# Altium footprint library Generic Footprint.PcbLib: 160 footprints (part 8 of 20) (continued)
## Symbol_CE-Logo-1.5x1mm_Silkscreen [mm] (continued)
1(0.638,0.019) 1(0.638,0.02) 1(0.638,0.022) 1(0.638,0.023) 1(0.638,0.025) 1(0.638,0.026) 1(0.638,0.028) 1(0.638,0.029) 1(0.638,0.031) 1(0.638,0.032) 1(0.638,0.034) 1(0.638,0.035) 1(0.638,0.037) 1(0.638,0.038) 1(0.638,0.04) 1(0.638,0.041) 1(0.638,0.043) 1(0.638,0.044) 1(0.638,0.046) 1(0.638,0.047) 1(0.638,0.049) 1(0.638,0.05) 1(0.638,0.052) 1(0.638,0.053) 1(0.638,0.055) 1(0.638,0.056) 1(0.638,0.058) 1(0.638,0.059) 1(0.638,0.061) 1(0.638,0.062) 1(0.638,0.064) 1(0.638,0.065) 1(0.638,0.067) 1(0.638,0.068) 1(0.638,0.07) 1(0.638,0.071) 1(0.638,0.073) 1(0.638,0.074) 1(0.638,0.076) 1(0.638,0.077) 1(0.638,0.079) 1(0.638,0.08) 1(0.638,0.082) 1(0.638,0.083) 1(0.638,0.085) 1(0.638,0.086) 1(0.638,0.088) 1(0.638,0.089) 1(0.638,0.091) 1(0.638,0.092) 1(0.638,0.094) 1(0.638,0.095) 1(0.638,0.097) 1(0.638,0.098) 1(0.638,0.1) 1(0.638,0.101) 1(0.638,0.103) 1(0.638,0.104) 1(0.638,0.106) 1(0.638,0.107) 1(0.638,0.109) 1(0.638,0.11) 1(0.638,0.112) 1(0.638,0.113) 1(0.638,0.115) 1(0.638,0.116) 1(0.638,0.118) 1(0.638,0.119) 1(0.638,0.121) 1(0.638,0.122) 1(0.638,0.124) 1(0.638,0.125) 1(0.638,0.127) 1(0.638,0.128) 1(0.638,0.13) 1(0.638,0.131) 1(0.638,0.133) 1(0.638,0.134) 1(0.638,0.136) 1(0.638,0.137) 1(0.638,0.139) 1(0.638,0.14) 1(0.638,0.142) 1(0.638,0.143) 1(0.638,0.145) 1(0.638,0.146) 1(0.638,0.148) 1(0.638,0.149) 1(0.638,0.151) 1(0.638,0.152) 1(0.638,0.154) 1(0.638,0.155) 1(0.638,0.157) 1(0.638,0.158) 1(0.638,0.16) 1(0.638,0.161) 1(0.638,0.163) 1(0.638,0.164) 1(0.638,0.166) 1(0.638,0.167) 1(0.638,0.902) 1(0.638,0.904) 1(0.638,0.905) 1(0.638,0.907) 1(0.638,0.908) 1(0.638,0.91) 1(0.638,0.911) 1(0.638,0.913) 1(0.638,0.914) 1(0.638,0.916) 1(0.638,0.917) 1(0.638,0.919) 1(0.638,0.92) 1(0.638,0.922) 1(0.638,0.923) 1(0.638,0.925) 1(0.638,0.926) 1(0.638,0.928) 1(0.638,0.929) 1(0.638,0.931) 1(0.638,0.932) 1(0.638,0.934) 1(0.638,0.935) 1(0.638,0.937) 1(0.638,0.938) 1(0.638,0.94) 1(0.638,0.941) 1(0.638,0.943) 1(0.638,0.944) 1(0.638,0.946) 1(0.638,0.947) 1(0.638,0.949) 1(0.638,0.95) 1(0.638,0.952) 1(0.638,0.953) 1(0.638,0.955) 1(0.638,0.956) 1(0.638,0.958) 1(0.638,0.959) 1(0.638,0.961) 1(0.638,0.962) 1(0.638,0.964) 1(0.638,0.965) 1(0.638,0.967) 1(0.638,0.968) 1(0.638,0.97) 1(0.638,0.971) 1(0.638,0.973) 1(0.638,0.974) 1(0.638,0.976) 1(0.638,0.977) 1(0.638,0.979) 1(0.638,0.98) 1(0.638,0.982) 1(0.638,0.983) 1(0.638,0.985) 1(0.638,0.986) 1(0.638,0.988) 1(0.638,0.989) 1(0.638,0.991) 1(0.638,0.992) 1(0.638,0.994) 1(0.638,0.995) 1(0.638,0.997) 1(0.638,0.998) 1(0.638,1) 1(0.638,1.001) 1(0.638,1.003) 1(0.638,1.004) 1(0.638,1.006) 1(0.638,1.007) 1(0.638,1.009) 1(0.638,1.01) 1(0.638,1.012) 1(0.638,1.013) 1(0.638,1.015) 1(0.638,1.016) 1(0.638,1.018) 1(0.638,1.019) 1(0.638,1.021) 1(0.638,1.022) 1(0.638,1.024) 1(0.638,1.025) 1(0.638,1.027) 1(0.638,1.028) 1(0.638,1.03) 1(0.638,1.031) 1(0.638,1.033) 1(0.638,1.034) 1(0.638,1.036) 1(0.638,1.037) 1(0.638,1.039) 1(0.638,1.04) 1(0.638,1.042) 1(0.638,1.043) 1(0.638,1.045) 1(0.638,1.046) 1(0.638,1.048) 1(0.638,1.049) 1(0.638,1.051) 1(0.638,1.052) 1(0.64,1.054) 1(0.956,0.511) 1(0.956,0.512) 1(0.956,0.514) 1(0.956,0.515) 1(0.956,0.517) 1(0.956,0.541) 1(0.956,0.542) 1(0.956,0.544) 1(0.956,0.547) 1(0.956,0.548) 1(0.956,0.55) 1(0.956,0.551) 1(0.956,0.553) 1(0.956,0.554) 1(0.956,0.556) 1(0.956,0.557) 1(0.956,0.559) 1(0.958,0.509) 1(0.958,0.518) 1(0.958,0.52) 1(0.958,0.521) 1(0.958,0.523) 1(0.958,0.524) 1(0.958,0.526) 1(0.958,0.527) 1(0.958,0.529) 1(0.958,0.53) 1(0.958,0.532) 1(0.958,0.533) 1(0.958,0.535) 1(0.958,0.536) 1(0.958,0.538) 1(0.958,0.539) 1(0.959,0.481) 1(0.959,0.482) 1(0.959,0.484) 1(0.959,0.485) 1(0.959,0.487) 1(0.959,0.488) 1(0.959,0.49) 1(0.959,0.491) 1(0.959,0.493) 1(0.959,0.494) 1(0.959,0.496) 1(0.959,0.497) 1(0.959,0.499) 1(0.959,0.5) 1(0.959,0.502) 1(0.959,0.503) 1(0.959,0.505) 1(0.959,0.506) 1(0.959,0.508) 1(0.959,0.545) 1(0.959,0.56) 1(0.959,0.562) 1(0.959,0.563) 1(0.959,0.565) 1(0.959,0.566) 1(0.959,0.568) 1(0.959,0.569) 1(0.959,0.571) 1(0.959,0.572) 1(0.959,0.574) 1(0.959,0.575) 1(0.959,0.577) 1(0.959,0.578) 1(0.959,0.58) 1(0.959,0.581) 1(0.961,0.478) 1(0.961,0.479) 1(0.962,0.454) 1(0.962,0.455) 1(0.962,0.461) 1(0.962,0.466) 1(0.962,0.469) 1(0.962,0.47) 1(0.962,0.472) 1(0.962,0.475) 1(0.962,0.476) 1(0.962,0.583) 1(0.962,0.586) 1(0.962,0.589) 1(0.962,0.59) 1(0.962,0.592) 1(0.962,0.593) 1(0.962,0.595) 1(0.962,0.596) 1(0.962,0.598) 1(0.962,0.599) 1(0.962,0.602) 1(0.962,0.608) 1(0.962,0.613) 1(0.964,0.449) 1(0.964,0.451) 1(0.964,0.452) 1(0.964,0.457) 1(0.964,0.458) 1(0.964,0.46) 1(0.964,0.463) 1(0.964,0.464) 1(0.964,0.467) 1(0.964,0.473) 1(0.964,0.584) 1(0.964,0.587) 1(0.964,0.601) 1(0.964,0.604) 1(0.964,0.605) 1(0.964,0.607) 1(0.964,0.61) 1(0.964,0.611) 1(0.964,0.614) 1(0.965,0.445) 1(0.965,0.446) 1(0.965,0.448) 1(0.965,0.616) 1(0.965,0.617) 1(0.965,0.619) 1(0.965,0.62) 1(0.967,0.43) 1(0.967,0.431) 1(0.967,0.44) 1(0.967,0.622) 1(0.967,0.623) 1(0.967,0.626) 1(0.967,0.632) 1(0.967,0.635) 1(0.968,0.424) 1(0.968,0.425) 1(0.968,0.427) 1(0.968,0.428) 1(0.968,0.433) 1(0.968,0.434) 1(0.968,0.436) 1(0.968,0.437) 1(0.968,0.439) 1(0.968,0.442) 1(0.968,0.443) 1(0.968,0.625) 1(0.968,0.628) 1(0.968,0.629) 1(0.968,0.631) 1(0.968,0.634) 1(0.968,0.637) 1(0.968,0.638) 1(0.968,0.644) 1(0.97,0.421) 1(0.97,0.422) 1(0.97,0.64) 1(0.97,0.641) 1(0.97,0.643) 1(0.971,0.415) 1(0.971,0.419) 1(0.973,0.406) 1(0.973,0.407) 1(0.973,0.409) 1(0.973,0.41) 1(0.973,0.412) 1(0.973,0.413) 1(0.973,0.416) 1(0.973,0.418) 1(0.973,0.646) 1(0.973,0.647) 1(0.973,0.649) 1(0.973,0.65) 1(0.973,0.652) 1(0.973,0.653) 1(0.973,0.655) 1(0.973,0.656) 1(0.973,0.658) 1(0.973,0.662) 1(0.974,0.401) 1(0.974,0.403) 1(0.974,0.404) 1(0.974,0.659) 1(0.974,0.661) 1(0.976,0.4) 1(0.976,0.664) 1(0.977,0.386) 1(0.977,0.389) 1(0.977,0.391) 1(0.977,0.392) 1(0.977,0.394) 1(0.977,0.395) 1(0.977,0.397) 1(0.977,0.398) 1(0.977,0.665) 1(0.977,0.667) 1(0.977,0.668) 1(0.977,0.67) 1(0.977,0.671) 1(0.977,0.673) 1(0.977,0.676) 1(0.977,0.677) 1(0.979,0.388) 1(0.979,0.674) 1(0.982,0.376) 1(0.982,0.38) 1(0.982,0.382) 1(0.982,0.383) 1(0.982,0.385) 1(0.982,0.679) 1(0.982,0.685) 1(0.983,0.371) 1(0.983,0.373) 1(0.983,0.374) 1(0.983,0.377) 1(0.983,0.379) 1(0.983,0.68) 1(0.983,0.682) 1(0.983,0.683) 1(0.983,0.686) 1(0.983,0.688) 1(0.983,0.689) 1(0.983,0.691) 1(0.983,0.692) 1(0.986,0.359) 1(0.986,0.368) 1(0.986,0.694) 1(0.986,0.695) 1(0.986,0.697) 1(0.986,0.701) 1(0.988,0.358) 1(0.988,0.361) 1(0.988,0.362) 1(0.988,0.364) 1(0.988,0.365) 1(0.988,0.367) 1(0.988,0.37) 1(0.988,0.698) 1(0.988,0.7) 1(0.988,0.703) 1(0.988,0.704) 1(0.988,0.706) 1(0.988,0.707) 1(0.991,0.356) 1(0.992,0.344) 1(0.992,0.346) 1(0.992,0.347) 1(0.992,0.349) 1(0.992,0.35) 1(0.992,0.352) 1(0.992,0.353) 1(0.992,0.355) 1(0.992,0.709) 1(0.992,0.71) 1(0.992,0.712) 1(0.992,0.713) 1(0.992,0.715) 1(0.992,0.716) 1(0.992,0.718) 1(0.992,0.719) 1(0.994,0.343) 1(0.994,0.721) 1(0.995,0.722) 1(0.997,0.332) 1(0.997,0.334) 1(0.997,0.335) 1(0.997,0.337) 1(0.997,0.338) 1(0.997,0.34) 1(0.997,0.341) 1(0.997,0.724) 1(0.997,0.725) 1(0.997,0.727) 1(0.997,0.728) 1(0.997,0.73) 1(0.997,0.731) 1(0.998,0.329) 1(0.998,0.331) 1(1.001,0.32) 1(1.001,0.325) 1(1.001,0.328) 1(1.001,0.733) 1(1.001,0.734) 1(1.001,0.736) 1(1.001,0.737) 1(1.001,0.739) 1(1.001,0.74) 1(1.003,0.322) 1(1.003,0.323) 1(1.003,0.326) 1(1.003,0.742) 1(1.003,0.743) 1(1.003,0.745) 1(1.004,0.319) 1(1.006,0.31) 1(1.006,0.313) 1(1.006,0.316) 1(1.006,0.317) 1(1.006,0.746) 1(1.006,0.751) 1(1.007,0.311) 1(1.007,0.314) 1(1.007,0.748) 1(1.007,0.749) 1(1.007,0.752) 1(1.007,0.754) 1(1.007,0.755) 1(1.009,0.308) 1(1.01,0.307) 1(1.012,0.301) 1(1.012,0.302) 1(1.012,0.304) 1(1.012,0.305) 1(1.012,0.757) 1(1.012,0.758) 1(1.012,0.76) 1(1.012,0.761) 1(1.012,0.763) 1(1.012,0.764) 1(1.013,0.299) 1(1.015,0.295) 1(1.015,0.766) 1(1.016,0.29) 1(1.016,0.292) 1(1.016,0.293) 1(1.016,0.296) 1(1.016,0.298) 1(1.016,0.767) 1(1.016,0.769) 1(1.016,0.77) 1(1.016,0.772) 1(1.016,0.773) 1(1.018,0.775) 1(1.021,0.283) 1(1.021,0.284) 1(1.021,0.286) 1(1.021,0.287) 1(1.021,0.289) 1(1.021,0.776) 1(1.021,0.778) 1(1.021,0.779) 1(1.021,0.781) 1(1.022,0.28) 1(1.022,0.281) 1(1.022,0.782) 1(1.022,0.784) 1(1.025,0.272) 1(1.025,0.274) 1(1.025,0.785) 1(1.027,0.275) 1(1.027,0.277) 1(1.027,0.278) 1(1.027,0.787) 1(1.027,0.788) 1(1.028,0.271) 1(1.03,0.79) 1(1.03,0.793) 1(1.031,0.266) 1(1.031,0.268) 1(1.031,0.269) 1(1.031,0.791) 1(1.031,0.794) 1(1.031,0.796) 1(1.031,0.797) 1(1.031,0.799) 1(1.034,0.26) 1(1.034,0.262) 1(1.034,0.265) 1(1.034,0.802) 1(1.036,0.257) 1(1.036,0.259) 1(1.036,0.263) 1(1.036,0.8) 1(1.036,0.803) 1(1.036,0.805) 1(1.036,0.806) 1(1.036,0.808) 1(1.039,0.256) 1(1.04,0.251) 1(1.04,0.253) 1(1.04,0.254) 1(1.04,0.809) 1(1.04,0.811) 1(1.04,0.812) 1(1.045,0.242) 1(1.045,0.244) 1(1.045,0.245) 1(1.045,0.247) 1(1.045,0.248) 1(1.045,0.25) 1(1.045,0.814) 1(1.045,0.815) 1(1.045,0.817) 1(1.045,0.818) 1(1.045,0.82) 1(1.045,0.821) 1(1.045,0.823) 1(1.049,0.241) 1(1.049,0.824) 1(1.049,0.827) 1(1.051,0.238) 1(1.051,0.239) 1(1.051,0.826) 1(1.052,0.236) 1(1.054,0.23) 1(1.054,0.233) 1(1.054,0.235) 1(1.054,0.829) 1(1.054,0.832) 1(1.055,0.227) 1(1.055,0.229) 1(1.055,0.232) 1(1.055,0.83) 1(1.055,0.833) 1(1.055,0.835) 1(1.055,0.836) 1(1.057,0.838) 1(1.06,0.223) 1(1.06,0.224) 1(1.06,0.226) 1(1.06,0.839) 1(1.06,0.841) 1(1.06,0.842) 1(1.063,0.844) 1(1.064,0.218) 1(1.064,0.22) 1(1.064,0.221) 1(1.064,0.845) 1(1.064,0.847) 1(1.069,0.212) 1(1.069,0.214) 1(1.069,0.217) 1(1.069,0.848) 1(1.069,0.85) 1(1.069,0.851) 1(1.069,0.853) 1(1.07,0.209) 1(1.07,0.211) 1(1.07,0.215) 1(1.07,0.854) 1(1.07,0.856) 1(1.072,0.208) 1(1.073,0.205) 1(1.073,0.206) 1(1.073,0.857) 1(1.075,0.203) 1(1.075,0.859) 1(1.075,0.86) 1(1.076,0.862) 1(1.079,0.199) 1(1.079,0.2) 1(1.079,0.202) 1(1.079,0.863) 1(1.079,0.865) 1(1.079,0.866) 1(1.081,0.197) 1(1.084,0.194) 1(1.084,0.196) 1(1.084,0.868) 1(1.084,0.869) 1(1.084,0.871) 1(1.085,0.193) 1(1.088,0.188) 1(1.088,0.19) 1(1.088,0.191) 1(1.088,0.872) 1(1.088,0.874) 1(1.088,0.875) 1(1.093,0.187) 1(1.093,0.877) 1(1.093,0.88) 1(1.094,0.184) 1(1.094,0.185) 1(1.094,0.878) 1(1.097,0.178) 1(1.097,0.179) 1(1.097,0.181) 1(1.097,0.182) 1(1.097,0.881) 1(1.097,0.884) 1(1.099,0.173) 1(1.099,0.175) 1(1.099,0.176) 1(1.099,0.883) 1(1.099,0.886) 1(1.099,0.887) 1(1.099,0.889) 1(1.1,0.89) 1(1.102,0.172) 1(1.103,0.17) 1(1.103,0.892) 1(1.103,0.893) 1(1.103,0.895) 1(1.105,0.169) 1(1.106,0.167) 1(1.106,0.896) 1(1.108,0.166) 1(1.108,0.898) 1(1.108,0.899) 1(1.112,0.161) 1(1.112,0.163) 1(1.112,0.164) 1(1.112,0.901) 1(1.112,0.902) 1(1.112,0.904) 1(1.114,0.16) 1(1.117,0.157) 1(1.117,0.158) 1(1.117,0.905) 1(1.118,0.155) 1(1.118,0.907) 1(1.118,0.908) 1(1.118,0.91) 1(1.12,0.449) 1(1.12,0.454) 1(1.12,0.455) 1(1.12,0.613) 1(1.12,0.614) 1(1.121,0.154) 1(1.121,0.448) 1(1.121,0.451) 1(1.121,0.452) 1(1.121,0.457) 1(1.121,0.611) 1(1.121,0.616) 1(1.123,0.149) 1(1.123,0.151) 1(1.123,0.152) 1(1.123,0.446) 1(1.123,0.617) 1(1.123,0.619) 1(1.123,0.62) 1(1.123,0.911) 1(1.123,0.913) 1(1.124,0.443) 1(1.124,0.458) 1(1.124,0.622) 1(1.124,0.623) 1(1.124,0.914) 1(1.126,0.43) 1(1.126,0.431) 1(1.126,0.433) 1(1.126,0.434) 1(1.126,0.436) 1(1.126,0.437) 1(1.126,0.439) 1(1.126,0.44) 1(1.126,0.442) 1(1.126,0.445) 1(1.126,0.458) 1(1.126,0.611) 1(1.126,0.625) 1(1.126,0.626) 1(1.126,0.628) 1(1.126,0.629) 1(1.126,0.631) 1(1.126,0.632) 1(1.126,0.634) 1(1.126,0.635) 1(1.127,0.148) 1(1.127,0.428) 1(1.127,0.457) 1(1.127,0.611) 1(1.127,0.637) 1(1.129,0.146) 1(1.129,0.427) 1(1.129,0.457) 1(1.129,0.638) 1(1.129,0.64) 1(1.13,0.145) 1(1.13,0.413) 1(1.13,0.415) 1(1.13,0.416) 1(1.13,0.418) 1(1.13,0.419) 1(1.13,0.421) 1(1.13,0.422) 1(1.13,0.424) 1(1.13,0.425) 1(1.13,0.641) 1(1.13,0.643) 1(1.13,0.644) 1(1.13,0.646) 1(1.13,0.647) 1(1.13,0.649) 1(1.13,0.65) 1(1.132,0.916) 1(1.132,0.917) 1(1.132,0.919) 1(1.133,0.652) 1(1.133,0.653) 1(1.135,0.401) 1(1.135,0.403) 1(1.135,0.404) 1(1.135,0.406) 1(1.135,0.407) 1(1.135,0.409) 1(1.135,0.41) 1(1.135,0.412) 1(1.135,0.655) 1(1.135,0.656) 1(1.135,0.658) 1(1.135,0.659) 1(1.135,0.661) 1(1.135,0.662) 1(1.135,0.664) 1(1.135,0.665) 1(1.136,0.14) 1(1.136,0.142) 1(1.136,0.143) 1(1.136,0.4) 1(1.136,0.92) 1(1.136,0.922) 1(1.136,0.923) 1(1.138,0.667) 1(1.139,0.391) 1(1.139,0.392) 1(1.139,0.394) 1(1.139,0.395) 1(1.139,0.397) 1(1.139,0.668) 1(1.139,0.67) 1(1.139,0.671) 1(1.139,0.673) 1(1.139,0.674) 1(1.139,0.676) 1(1.139,0.677) 1(1.139,0.679) 1(1.141,0.136) 1(1.141,0.137) 1(1.141,0.139) 1(1.141,0.389) 1(1.141,0.398) 1(1.141,0.68) 1(1.141,0.925) 1(1.141,0.926) 1(1.141,0.928) 1(1.141,0.929) 1(1.142,0.389) 1(1.142,0.68) 1(1.142,0.929) 1(1.144,0.385) 1(1.144,0.386) 1(1.144,0.388) 1(1.144,0.389) 1(1.144,0.68) 1(1.145,0.134) 1(1.145,0.376) 1(1.145,0.377) 1(1.145,0.379) 1(1.145,0.38) 1(1.145,0.382) 1(1.145,0.383) 1(1.145,0.682) 1(1.145,0.683) 1(1.145,0.685) 1(1.145,0.686) 1(1.145,0.688) 1(1.145,0.689) 1(1.145,0.929) 1(1.145,0.931) 1(1.145,0.932) 1(1.147,0.131) 1(1.147,0.133) 1(1.147,0.934) 1(1.15,0.365) 1(1.15,0.367) 1(1.15,0.368) 1(1.15,0.37) 1(1.15,0.371) 1(1.15,0.373) 1(1.15,0.374) 1(1.15,0.691) 1(1.15,0.692) 1(1.15,0.694) 1(1.15,0.695) 1(1.15,0.697) 1(1.15,0.698) 1(1.151,0.127) 1(1.151,0.128) 1(1.151,0.13) 1(1.151,0.935) 1(1.151,0.937) 1(1.151,0.938) 1(1.153,0.125) 1(1.153,0.7) 1(1.154,0.125) 1(1.154,0.356) 1(1.154,0.358) 1(1.154,0.359) 1(1.154,0.361) 1(1.154,0.362) 1(1.154,0.364) 1(1.154,0.701) 1(1.154,0.703) 1(1.154,0.704) 1(1.154,0.706) 1(1.154,0.707) 1(1.156,0.122) 1(1.156,0.124) 1(1.156,0.125) 1(1.156,0.94) 1(1.156,0.941) 1(1.157,0.121) 1(1.157,0.709) 1(1.157,0.943) 1(1.159,0.352) 1(1.159,0.353) 1(1.159,0.355) 1(1.159,0.71) 1(1.159,0.712) 1(1.159,0.713) 1(1.159,0.716) 1(1.159,0.718) 1(1.16,0.715) 1(1.162,0.121) 1(1.162,0.35) 1(1.163,0.121) 1(1.163,0.343) 1(1.163,0.346) 1(1.163,0.347) 1(1.163,0.349) 1(1.163,0.719) 1(1.163,0.721) 1(1.163,0.722) 1(1.165,0.116) 1(1.165,0.119) 1(1.165,0.341) 1(1.165,0.344) 1(1.165,0.724) 1(1.165,0.944) 1(1.165,0.946) 1(1.165,0.947) 1(1.166,0.118) 1(1.168,0.34) 1(1.169,0.115) 1(1.169,0.332) 1(1.169,0.334) 1(1.169,0.335) 1(1.169,0.337) 1(1.169,0.338) 1(1.169,0.725) 1(1.169,0.727) 1(1.169,0.728) 1(1.169,0.73) 1(1.169,0.731) 1(1.169,0.733) 1(1.169,0.949) 1(1.171,0.112) 1(1.171,0.113) 1(1.171,0.95) 1(1.171,0.952) 1(1.171,0.953) 1(1.174,0.328) 1(1.174,0.329) 1(1.174,0.331) 1(1.174,0.734) 1(1.174,0.736) 1(1.174,0.737) 1(1.174,0.955) 1(1.175,0.107) 1(1.175,0.109) 1(1.175,0.11) 1(1.175,0.956) 1(1.177,0.326) 1(1.177,0.739) 1(1.177,0.958) 1(1.178,0.317) 1(1.178,0.319) 1(1.178,0.32) 1(1.178,0.322) 1(1.178,0.323) 1(1.178,0.325) 1(1.178,0.74) 1(1.178,0.742) 1(1.178,0.743) 1(1.178,0.745) 1(1.178,0.746) 1(1.18,0.106) 1(1.181,0.106) 1(1.181,0.748) 1(1.183,0.106) 1(1.183,0.314) 1(1.183,0.316) 1(1.183,0.749) 1(1.183,0.751) 1(1.184,0.103) 1(1.184,0.313) 1(1.184,0.959) 1(1.184,0.961) 1(1.184,0.962) 1(1.186,0.101) 1(1.186,0.104) 1(1.186,0.752) 1(1.187,0.311) 1(1.187,0.754) 1(1.187,0.755) 1(1.187,0.76) 1(1.189,0.1) 1(1.189,0.308) 1(1.189,0.31) 1(1.189,0.757) 1(1.189,0.758) 1(1.189,0.761) 1(1.189,0.964) 1(1.19,0.098) 1(1.19,0.965) 1(1.19,0.967) 1(1.192,0.097) 1(1.192,0.305) 1(1.192,0.307) 1(1.193,0.298) 1(1.193,0.299) 1(1.193,0.301) 1(1.193,0.302) 1(1.193,0.304) 1(1.193,0.763) 1(1.193,0.764) 1(1.193,0.766) 1(1.195,0.097) 1(1.196,0.097) 1(1.198,0.295) 1(1.198,0.296) 1(1.198,0.767) 1(1.198,0.769) 1(1.198,0.77) 1(1.198,0.968) 1(1.199,0.092) 1(1.199,0.094) 1(1.199,0.095) 1(1.199,0.293) 1(1.199,0.772) 1(1.199,0.97) 1(1.199,0.971) 1(1.201,0.772) 1(1.202,0.289) 1(1.202,0.29) 1(1.202,0.292) 1(1.202,0.772) 1(1.202,0.773) 1(1.202,0.775) 1(1.202,0.973) 1(1.204,0.089) 1(1.204,0.091) 1(1.204,0.974) 1(1.204,0.976) 1(1.205,0.776) 1(1.205,0.977) 1(1.207,0.088) 1(1.207,0.286) 1(1.207,0.287) 1(1.207,0.778) 1(1.207,0.779) 1(1.208,0.284) 1(1.208,0.781) 1(1.211,0.28) 1(1.211,0.283) 1(1.211,0.782) 1(1.211,0.785) 1(1.213,0.086) 1(1.213,0.281) 1(1.213,0.784) 1(1.213,0.979) 1(1.213,0.98) 1(1.214,0.083) 1(1.214,0.085) 1(1.214,0.278) 1(1.214,0.982) 1(1.216,0.278) 1(1.216,0.787) 1(1.217,0.274) 1(1.217,0.275) 1(1.217,0.277) 1(1.217,0.278) 1(1.217,0.788) 1(1.217,0.79) 1(1.217,0.983) 1(1.219,0.082) 1(1.219,0.791) 1(1.219,0.985) 1(1.22,0.082) 1(1.22,0.457) 1(1.22,0.986) 1(1.222,0.082) 1(1.222,0.269) 1(1.222,0.271) 1(1.222,0.272) 1(1.222,0.457) 1(1.222,0.793) 1(1.222,0.794) 1(1.223,0.077) 1(1.223,0.079) 1(1.223,0.08) 1(1.223,0.796) 1(1.226,0.265) 1(1.226,0.266) 1(1.226,0.268) 1(1.226,0.457) 1(1.226,0.797) 1(1.226,0.799) 1(1.226,0.8) 1(1.226,0.988) 1(1.228,0.076) 1(1.228,0.989) 1(1.228,0.991) 1(1.229,0.074) 1(1.229,0.457) 1(1.231,0.263) 1(1.231,0.457) 1(1.231,0.802) 1(1.231,0.803) 1(1.232,0.26) 1(1.232,0.262) 1(1.232,0.457) 1(1.232,0.805) 1(1.234,0.073) 1(1.234,0.992) 1(1.235,0.992) 1(1.237,0.254) 1(1.237,0.256) 1(1.237,0.257) 1(1.237,0.259) 1(1.237,0.806) 1(1.237,0.808) 1(1.237,0.809) 1(1.238,0.07) 1(1.238,0.071) 1(1.238,0.992) 1(1.238,0.994) 1(1.238,0.995) 1(1.24,0.068) 1(1.241,0.25) 1(1.241,0.251) 1(1.241,0.253) 1(1.241,0.811) 1(1.241,0.812) 1(1.241,0.814) 1(1.241,0.997) 1(1.244,0.457) 1(1.246,0.245) 1(1.246,0.247) 1(1.246,0.248) 1(1.246,0.457) 1(1.246,0.815) 1(1.246,0.817) 1(1.246,0.818) 1(1.246,0.997) 1(1.247,0.065) 1(1.247,0.067) 1(1.247,0.82) 1(1.247,0.997) 1(1.247,0.998) 1(1.249,0.064) 1(1.249,0.82) 1(1.249,1) 1(1.249,1.001) 1(1.25,0.457) 1(1.25,0.82) 1(1.25,0.821) 1(1.25,0.823) 1(1.252,0.824) 1(1.253,0.457) 1(1.255,0.242) 1(1.255,0.244) 1(1.256,0.061) 1(1.256,0.062) 1(1.256,0.241) 1(1.256,1.003) 1(1.258,1.004) 1(1.258,1.006) 1(1.259,0.059) 1(1.259,0.239) 1(1.259,0.826) 1(1.261,0.236) 1(1.261,0.238) 1(1.261,0.827) 1(1.261,0.829) 1(1.262,0.058) 1(1.264,0.058) 1(1.265,0.058) 1(1.265,0.23) 1(1.265,0.232) 1(1.265,0.233) 1(1.265,0.235) 1(1.265,0.83) 1(1.265,0.832) 1(1.265,0.833) 1(1.267,0.056) 1(1.267,0.835) 1(1.267,1.007) 1(1.267,1.009) 1(1.268,0.055) 1(1.268,0.835) 1(1.268,1.01) 1(1.27,0.835) 1(1.27,0.836) 1(1.27,0.838) 1(1.271,0.053) 1(1.271,0.839) 1(1.273,0.839) 1(1.274,0.227) 1(1.274,0.229) 1(1.276,0.226) 1(1.276,1.012) 1(1.277,1.013) 1(1.279,0.839) 1(1.279,0.842) 1(1.279,1.015) 1(1.279,1.016) 1(1.28,0.049) 1(1.28,0.05) 1(1.28,0.052) 1(1.28,0.221) 1(1.28,0.223) 1(1.28,0.224) 1(1.28,0.841) 1(1.28,0.844) 1(1.28,1.016) 1(1.282,0.049) 1(1.282,0.844) 1(1.283,0.049) 1(1.285,0.844) 1(1.285,0.845) 1(1.285,0.847) 1(1.285,0.848) 1(1.288,0.22) 1(1.289,0.217) 1(1.289,0.218) 1(1.289,1.016) 1(1.291,0.046) 1(1.291,0.047) 1(1.291,1.018) 1(1.291,1.019) 1(1.292,0.044) 1(1.294,0.85) 1(1.294,0.851) 1(1.294,0.853) 1(1.294,1.021) 1(1.295,0.215) 1(1.298,0.214) 1(1.3,0.212) 1(1.301,0.211) 1(1.301,1.022) 1(1.301,1.024) 1(1.303,0.211) 1(1.303,0.854) 1(1.304,0.043) 1(1.304,0.206) 1(1.304,0.208) 1(1.304,0.209) 1(1.304,0.211) 1(1.304,0.856) 1(1.304,0.857) 1(1.304,0.859) 1(1.304,1.025) 1(1.306,0.04) 1(1.306,0.041) 1(1.306,0.859) 1(1.309,0.859) 1(1.313,0.202) 1(1.313,0.203) 1(1.313,0.205) 1(1.313,0.86) 1(1.313,0.862) 1(1.315,1.027) 1(1.315,1.028) 1(1.316,0.863) 1(1.316,1.03) 1(1.319,0.035) 1(1.319,0.037) 1(1.319,0.038) 1(1.321,0.865) 1(1.324,0.034) 1(1.324,0.197) 1(1.324,0.199) 1(1.324,0.2) 1(1.324,0.866) 1(1.325,0.868) 1(1.328,1.031) 1(1.328,1.033) 1(1.33,0.196) 1(1.331,0.196) 1(1.331,0.457) 1(1.331,1.034) 1(1.333,0.193) 1(1.333,0.194) 1(1.333,0.196) 1(1.333,0.457) 1(1.333,0.869) 1(1.333,0.871) 1(1.334,0.031) 1(1.334,0.032) 1(1.334,0.872) 1(1.339,0.457) 1(1.34,0.029) 1(1.34,0.457) 1(1.342,0.874) 1(1.342,0.875) 1(1.342,0.877) 1(1.342,1.036) 1(1.343,0.191) 1(1.343,1.036) 1(1.346,0.19) 1(1.348,0.028) 1(1.348,0.187) 1(1.348,0.188) 1(1.348,1.036) 1(1.348,1.037) 1(1.348,1.039) 1(1.349,0.026) 1(1.349,0.878) 1(1.351,0.187) 1(1.351,0.457) 1(1.351,0.878) 1(1.352,0.457) 1(1.354,0.025) 1(1.354,0.187) 1(1.354,0.878) 1(1.355,0.025) 1(1.355,1.04) 1(1.357,0.88) 1(1.358,0.025) 1(1.358,0.185) 1(1.358,0.881) 1(1.361,0.182) 1(1.361,0.184) 1(1.363,1.042) 1(1.364,0.883) 1(1.367,0.023) 1(1.369,0.022) 1(1.369,1.043) 1(1.37,0.181) 1(1.37,0.884) 1(1.372,0.886) 1(1.372,1.045) 1(1.376,0.02) 1(1.376,0.178) 1(1.376,0.179) 1(1.376,0.887) 1(1.384,0.889) 1(1.385,0.89) 1(1.387,0.892) 1(1.387,1.046) 1(1.388,0.176) 1(1.388,0.892) 1(1.388,1.048) 1(1.39,0.892) 1(1.391,0.017) 1(1.391,0.019) 1(1.391,0.173) 1(1.391,0.175) 1(1.394,1.049) 1(1.396,0.014) 1(1.396,0.016) 1(1.397,0.014) 1(1.397,0.016) 1(1.399,0.014) 1(1.399,0.016) 1(1.402,0.014) 1(1.402,0.893) 1(1.403,0.892) 1(1.403,0.893) 1(1.405,0.892) 1(1.405,0.893) 1(1.405,0.895) 1(1.405,0.896) 1(1.408,0.172) 1(1.409,0.014) 1(1.412,0.17) 1(1.415,0.013) 1(1.415,0.167) 1(1.415,0.169) 1(1.415,1.051) 1(1.415,1.052) 1(1.415,1.054) 1(1.417,0.013) 1(1.418,0.011) 1(1.418,0.013) 1(1.418,1.054) 1(1.42,0.011) 1(1.42,0.013) 1(1.42,0.014) 1(1.421,0.014) 1(1.421,0.167) 1(1.421,0.898) 1(1.423,0.014) 1(1.423,0.167) 1(1.423,1.054) 1(1.424,0.014) 1(1.424,0.167) 1(1.427,0.167) 1(1.429,0.167) 1(1.429,0.593) 1(1.429,0.596) 1(1.43,0.013) 1(1.432,0.167) 1(1.432,0.458) 1(1.432,0.46) 1(1.432,0.461) 1(1.432,0.463) 1(1.432,0.464) 1(1.432,0.466) 1(1.432,0.467) 1(1.432,0.469) 1(1.432,0.47) 1(1.432,0.472) 1(1.432,0.473) 1(1.432,0.475) 1(1.432,0.476) 1(1.432,0.478) 1(1.432,0.479) 1(1.432,0.481) 1(1.432,0.482) 1(1.432,0.484) 1(1.432,0.485) 1(1.432,0.487) 1(1.432,0.488) 1(1.432,0.49) 1(1.432,0.491) 1(1.432,0.493) 1(1.432,0.494) 1(1.432,0.496) 1(1.432,0.497) 1(1.432,0.499) 1(1.432,0.5) 1(1.432,0.502) 1(1.432,0.503) 1(1.432,0.505) 1(1.432,0.506) 1(1.432,0.508) 1(1.432,0.509) 1(1.432,0.511) 1(1.432,0.512) 1(1.432,0.514) 1(1.432,0.515) 1(1.432,0.517) 1(1.432,0.518) 1(1.432,0.52) 1(1.432,0.521) 1(1.432,0.523) 1(1.432,0.524) 1(1.432,0.526) 1(1.432,0.527) 1(1.432,0.529) 1(1.432,0.53) 1(1.432,0.532) 1(1.432,0.533) 1(1.432,0.535) 1(1.432,0.536) 1(1.432,0.538) 1(1.432,0.539) 1(1.432,0.541) 1(1.432,0.542) 1(1.432,0.544) 1(1.432,0.545) 1(1.432,0.547) 1(1.432,0.548) 1(1.432,0.55) 1(1.432,0.551) 1(1.432,0.553) 1(1.432,0.554) 1(1.432,0.556) 1(1.432,0.557) 1(1.432,0.559) 1(1.432,0.56) 1(1.432,0.562) 1(1.432,0.563) 1(1.432,0.565) 1(1.432,0.566) 1(1.432,0.568) 1(1.432,0.569) 1(1.432,0.571) 1(1.432,0.572) 1(1.432,0.574) 1(1.432,0.575) 1(1.432,0.577) 1(1.432,0.578) 1(1.432,0.58) 1(1.432,0.581) 1(1.432,0.583) 1(1.432,0.584) 1(1.432,0.586) 1(1.432,0.587) 1(1.432,0.589) 1(1.432,0.59) 1(1.432,0.592) 1(1.432,0.595) 1(1.432,0.598) 1(1.432,0.599) 1(1.432,0.601) 1(1.432,0.602) 1(1.432,0.604) 1(1.432,0.605) 1(1.432,0.607) 1(1.432,0.608) 1(1.432,0.61) 1(1.433,0.899) 1(1.435,0.901) 1(1.439,0.167) 1(1.439,0.902) 1(1.441,0.902) 1(1.444,0.011) 1(1.444,0.166) 1(1.444,0.167) 1(1.448,1.055) 1(1.453,0.01) 1(1.453,0.164) 1(1.454,0.163) 1(1.454,1.055) 1(1.456,0.01) 1(1.456,0.902) 1(1.457,0.01) 1(1.457,0.902) 1(1.459,0.901) 1(1.46,1.055) 1(1.462,1.055) 1(1.463,0.01) 1(1.463,0.901) 1(1.463,1.055) 1(1.465,0.01) 1(1.465,0.902) 1(1.466,0.01) 1(1.468,0.01) 1(1.468,0.163) 1(1.469,0.008) 1(1.471,0.008) 1(1.471,1.055) 1(1.475,1.055) 1(1.478,1.055) 1(1.483,1.055) 1(1.492,1.057) 1(1.495,0.008) 1(1.496,0.008) 1(1.496,1.057) 1(1.498,0.01) 1(1.498,1.055) 1(1.499,0.01) 1(1.499,1.055) 1(1.501,1.055) 1(1.502,1.055) 1(1.505,0.902) 1(1.507,0.163) 1(1.507,0.901) 1(1.511,0.163) 1(1.513,0.01) 1(1.513,0.164) 1(1.513,0.901) 1(1.513,0.902) 1(1.514,0.902) 1(1.516,1.055) 1(1.517,0.01) 1(1.519,0.01) 1(1.52,1.055) 1(1.522,0.166) 1(1.522,0.167) 1(1.522,1.055) 1(1.526,0.167) 1(1.528,0.011) 1(1.534,0.013) 1(1.534,0.014) 1(1.534,0.016) 1(1.534,0.017) 1(1.534,0.019) 1(1.534,0.02) 1(1.534,0.022) 1(1.534,0.023) 1(1.534,0.025) 1(1.534,0.026) 1(1.534,0.028) 1(1.534,0.029) 1(1.534,0.031) 1(1.534,0.032) 1(1.534,0.034) 1(1.534,0.035) 1(1.534,0.037) 1(1.534,0.038) 1(1.534,0.04) 1(1.534,0.041) 1(1.534,0.043) 1(1.534,0.044) 1(1.534,0.046) 1(1.534,0.047) 1(1.534,0.049) 1(1.534,0.05) 1(1.534,0.052) 1(1.534,0.053) 1(1.534,0.055) 1(1.534,0.056) 1(1.534,0.058) 1(1.534,0.059) 1(1.534,0.061) 1(1.534,0.062) 1(1.534,0.064) 1(1.534,0.065) 1(1.534,0.067) 1(1.534,0.068) 1(1.534,0.07) 1(1.534,0.071) 1(1.534,0.073) 1(1.534,0.074) 1(1.534,0.076) 1(1.534,0.077) 1(1.534,0.079) 1(1.534,0.08) 1(1.534,0.082) 1(1.534,0.083) 1(1.534,0.085) 1(1.534,0.086) 1(1.534,0.088) 1(1.534,0.091) 1(1.534,0.092) 1(1.534,0.094) 1(1.534,0.097) 1(1.534,0.098) 1(1.534,0.1) 1(1.534,0.101) 1(1.534,0.103) 1(1.534,0.104) 1(1.534,0.107) 1(1.534,0.109) 1(1.534,0.11) 1(1.534,0.112) 1(1.534,0.113) 1(1.534,0.115) 1(1.534,0.116) 1(1.534,0.118) 1(1.534,0.119) 1(1.534,0.121) 1(1.534,0.122) 1(1.534,0.124) 1(1.534,0.125) 1(1.534,0.127) 1(1.534,0.128) 1(1.534,0.13) 1(1.534,0.131) 1(1.534,0.133) 1(1.534,0.134) 1(1.534,0.136) 1(1.534,0.137) 1(1.534,0.139) 1(1.534,0.14) 1(1.534,0.142) 1(1.534,0.143) 1(1.534,0.145) 1(1.534,0.146) 1(1.534,0.148) 1(1.534,0.149) 1(1.534,0.151) 1(1.534,0.152) 1(1.534,0.154) 1(1.534,0.155) 1(1.534,0.157) 1(1.534,0.158) 1(1.534,0.16) 1(1.534,0.161) 1(1.534,0.163) 1(1.534,0.164) 1(1.534,0.166) 1(1.535,0.089) 1(1.535,0.095) 1(1.535,0.106) 1(1.535,0.902) 1(1.535,0.905) 1(1.535,0.907) 1(1.535,0.908) 1(1.535,0.911) 1(1.535,0.913) 1(1.535,0.914) 1(1.535,0.916) 1(1.535,0.917) 1(1.535,0.919) 1(1.535,0.92) 1(1.535,0.922) 1(1.535,0.923) 1(1.535,0.925) 1(1.535,0.926) 1(1.535,0.928) 1(1.535,0.929) 1(1.535,0.931) 1(1.535,0.932) 1(1.535,0.934) 1(1.535,0.935) 1(1.535,0.937) 1(1.535,0.938) 1(1.535,0.94) 1(1.535,0.941) 1(1.535,0.943) 1(1.535,0.944) 1(1.535,0.946) 1(1.535,0.947) 1(1.535,0.949) 1(1.535,0.95) 1(1.535,0.952) 1(1.535,0.953) 1(1.535,0.955) 1(1.535,0.958) 1(1.535,0.959) 1(1.535,0.961) 1(1.535,0.962) 1(1.535,0.964) 1(1.535,0.965) 1(1.535,0.967) 1(1.535,0.97) 1(1.535,0.971) 1(1.535,0.973) 1(1.535,0.976) 1(1.535,0.977) 1(1.535,0.979) 1(1.535,0.98) 1(1.535,0.983) 1(1.535,0.985) 1(1.535,0.986) 1(1.535,0.988) 1(1.535,0.989) 1(1.535,0.991) 1(1.535,0.992) 1(1.535,0.995) 1(1.535,0.997) 1(1.535,0.998) 1(1.535,1) 1(1.535,1.001) 1(1.535,1.003) 1(1.535,1.004) 1(1.535,1.006) 1(1.535,1.007) 1(1.535,1.009) 1(1.535,1.01) 1(1.535,1.013) 1(1.535,1.015) 1(1.535,1.016) 1(1.535,1.019) 1(1.535,1.021) 1(1.535,1.022) 1(1.535,1.024) 1(1.535,1.025) 1(1.535,1.027) 1(1.535,1.028) 1(1.535,1.031) 1(1.535,1.033) 1(1.535,1.034) 1(1.535,1.036) 1(1.535,1.039) 1(1.535,1.04) 1(1.535,1.042) 1(1.535,1.043) 1(1.535,1.046) 1(1.535,1.048) 1(1.535,1.049) 1(1.535,1.051) 1(1.535,1.052) 1(1.535,1.054) 1(1.537,0.904) 1(1.537,0.91) 1(1.537,0.956) 1(1.537,0.968) 1(1.537,0.974) 1(1.537,0.982) 1(1.537,0.994) 1(1.537,1.012) 1(1.537,1.018) 1(1.537,1.03) 1(1.537,1.037) 1(1.537,1.045)
Top Overlay:
  drawing of 1554 lines, arcs and shapes, not listed